# Altium footprint library Package_QFP.PcbLib: 84 footprints (part 2 of 6)
Each footprint in its own frame and in the unit in brackets; x right, y up, seen from the top. Pads: shape width x height; smd on the part's side, far side on the other; paste and mask are expansions set on the pad; w line width, h text height; cw(c..) or ccw(c..) is an arc to the next point about the centre after c.
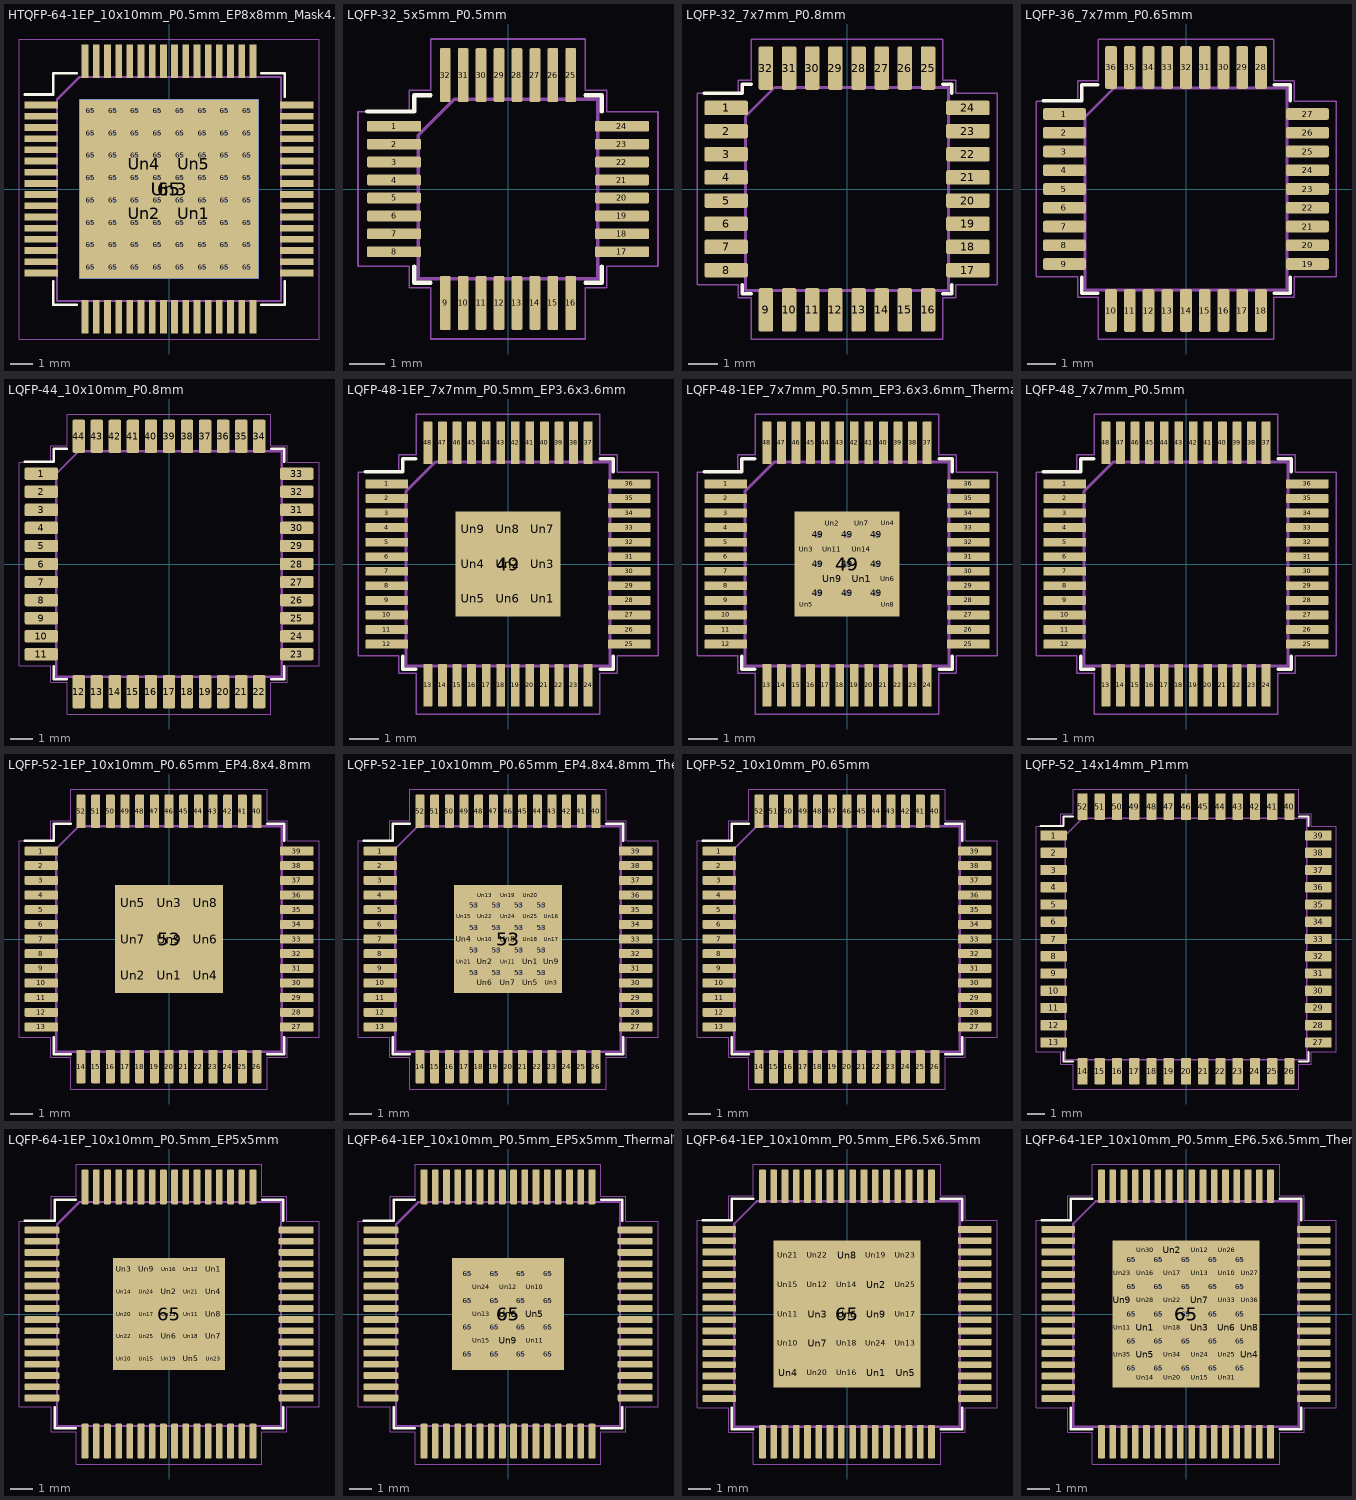
[diagram p1: the footprints below, top view; thin cyan lines are the x and y axes]

## HTQFP-64-1EP_10x10mm_P0.5mm_EP8x8mm_Mask4.4x4.4mm_ThermalVias [mm]
pads (135):
  rect 1.5x0.3 smd: 1(-5.7,3.75) 2(-5.7,3.25) 3(-5.7,2.75) 4(-5.7,2.25) 5(-5.7,1.75) 6(-5.7,1.25) 7(-5.7,0.75) 8(-5.7,0.25) 9(-5.7,-0.25) 10(-5.7,-0.75) 11(-5.7,-1.25) 12(-5.7,-1.75) 13(-5.7,-2.25) 14(-5.7,-2.75) 15(-5.7,-3.25) 16(-5.7,-3.75) 33(5.7,-3.75) 34(5.7,-3.25) 35(5.7,-2.75) 36(5.7,-2.25) 37(5.7,-1.75) 38(5.7,-1.25) 39(5.7,-0.75) 40(5.7,-0.25) 41(5.7,0.25) 42(5.7,0.75) 43(5.7,1.25) 44(5.7,1.75) 45(5.7,2.25) 46(5.7,2.75) 47(5.7,3.25) 48(5.7,3.75)
  rect 0.3x1.5 smd: 17(-3.75,-5.7) 18(-3.25,-5.7) 19(-2.75,-5.7) 20(-2.25,-5.7) 21(-1.75,-5.7) 22(-1.25,-5.7) 23(-0.75,-5.7) 24(-0.25,-5.7) 25(0.25,-5.7) 26(0.75,-5.7) 27(1.25,-5.7) 28(1.75,-5.7) 29(2.25,-5.7) 30(2.75,-5.7) 31(3.25,-5.7) 32(3.75,-5.7) 49(3.75,5.7) 50(3.25,5.7) 51(2.75,5.7) 52(2.25,5.7) 53(1.75,5.7) 54(1.25,5.7) 55(0.75,5.7) 56(0.25,5.7) 57(-0.25,5.7) 58(-0.75,5.7) 59(-1.25,5.7) 60(-1.75,5.7) 61(-2.25,5.7) 62(-2.75,5.7) 63(-3.25,5.7) 64(-3.75,5.7)
  round 0.5 hole 0.2: 65(-3.5,-3.5) 65(-3.5,-2.5) 65(-3.5,-1.5) 65(-3.5,-0.5) 65(-3.5,0.5) 65(-3.5,1.5) 65(-3.5,2.5) 65(-3.5,3.5) 65(-2.5,-3.5) 65(-2.5,-2.5) 65(-2.5,-1.5) 65(-2.5,-0.5) 65(-2.5,0.5) 65(-2.5,1.5) 65(-2.5,2.5) 65(-2.5,3.5) 65(-1.5,-3.5) 65(-1.5,-2.5) 65(-1.5,-1.5) 65(-1.5,-0.5) 65(-1.5,0.5) 65(-1.5,1.5) 65(-1.5,2.5) 65(-1.5,3.5) 65(-0.5,-3.5) 65(-0.5,-2.5) 65(-0.5,-1.5) 65(-0.5,-0.5) 65(-0.5,0.5) 65(-0.5,1.5) 65(-0.5,2.5) 65(-0.5,3.5) 65(0.5,-3.5) 65(0.5,-2.5) 65(0.5,-1.5) 65(0.5,-0.5) 65(0.5,0.5) 65(0.5,1.5) 65(0.5,2.5) 65(0.5,3.5) 65(1.5,-3.5) 65(1.5,-2.5) 65(1.5,-1.5) 65(1.5,-0.5) 65(1.5,0.5) 65(1.5,1.5) 65(1.5,2.5) 65(1.5,3.5) 65(2.5,-3.5) 65(2.5,-2.5) 65(2.5,-1.5) 65(2.5,-0.5) 65(2.5,0.5) 65(2.5,1.5) 65(2.5,2.5) 65(2.5,3.5) 65(3.5,-3.5) 65(3.5,-2.5) 65(3.5,-1.5) 65(3.5,-0.5) 65(3.5,0.5) 65(3.5,1.5) 65(3.5,2.5) 65(3.5,3.5)
  rect 8x8 smd: 65(0,0)
  rect 8x8 smd far side: 65(0,0)
  rect 1.75x1.75 on Top Paste: Un1(1.1,-1.1) Un2(-1.1,-1.1) Un4(-1.1,1.1) Un5(1.1,1.1)
  rect 4.4x4.4 on Top Solder: Un3(0,0)
F.SilkS:
  lines w0.12: -6.45,4.225 -5.175,4.225 -5.175,5.175 -4.125,5.175 ; -5.175,-4.125 -5.175,-5.175 -4.125,-5.175 ; 4.125,-5.175 5.175,-5.175 5.175,-4.125 ; 4.125,5.175 5.175,5.175 5.175,4.125
F.CrtYd:
  lines w0.05: -6.7,-6.7 6.7,-6.7 6.7,6.7 -6.7,6.7 -6.7,-6.7
F.Fab:
  lines w0.1: -5,-5 -5,4 -4,5 5,5 5,-5 -5,-5
  text "'.Designator'" at -4.047,-0.84 h1
3D body "TQFP-64-1EP_10x10mm_P0.5mm_EP8x8mm.step": height 1.1, standoff 0, extent -6,-6 6,6

## LQFP-32_5x5mm_P0.5mm [mm]
pads (32):
  rrect25% 1.5x0.3 smd: 1(-3.175,1.75) 2(-3.175,1.25) 3(-3.175,0.75) 4(-3.175,0.25) 5(-3.175,-0.25) 6(-3.175,-0.75) 7(-3.175,-1.25) 8(-3.175,-1.75) 17(3.175,-1.75) 18(3.175,-1.25) 19(3.175,-0.75) 20(3.175,-0.25) 21(3.175,0.25) 22(3.175,0.75) 23(3.175,1.25) 24(3.175,1.75)
  rrect25% 0.3x1.5 smd: 9(-1.75,-3.175) 10(-1.25,-3.175) 11(-0.75,-3.175) 12(-0.25,-3.175) 13(0.25,-3.175) 14(0.75,-3.175) 15(1.25,-3.175) 16(1.75,-3.175) 25(1.75,3.175) 26(1.25,3.175) 27(0.75,3.175) 28(0.25,3.175) 29(-0.25,3.175) 30(-0.75,3.175) 31(-1.25,3.175) 32(-1.75,3.175)
F.SilkS:
  lines w0.12: -3.925,2.16 -2.61,2.16 -2.61,2.61 -2.16,2.61 ; -2.61,-2.16 -2.61,-2.61 -2.16,-2.61 ; 2.16,-2.61 2.61,-2.61 2.61,-2.16 ; 2.16,2.61 2.61,2.61 2.61,2.16
F.CrtYd:
  lines w0.05: -4.18,-2.15 -2.75,-2.15 -2.75,-2.75 -2.15,-2.75 -2.15,-4.18 0,-4.18 2.15,-4.18 2.15,-2.75 2.75,-2.75 2.75,-2.15 4.18,-2.15 4.18,0 4.18,2.15 2.75,2.15 2.75,2.75 2.15,2.75 2.15,4.18 0,4.18 -2.15,4.18 -2.15,2.75 -2.75,2.75 -2.75,2.15 -4.18,2.15 -4.18,0 -4.18,-2.15
F.Fab:
  lines w0.1: -2.5,-2.5 2.5,-2.5 2.5,2.5 -1.5,2.5 -2.5,1.5 -2.5,-2.5
  text "'.Designator'" at -4.047,-0.84 h1
3D body "LQFP-32-1EP_5x5mm_P0.5mm_EP3.45x3.45mm.step": height 1.5, standoff 0, extent -3.5,-3.5 3.5,3.5

## LQFP-32_7x7mm_P0.8mm [mm]
pads (32):
  rrect25% 1.5x0.5 smd: 1(-4.175,2.8) 2(-4.175,2) 3(-4.175,1.2) 4(-4.175,0.4) 5(-4.175,-0.4) 6(-4.175,-1.2) 7(-4.175,-2) 8(-4.175,-2.8) 17(4.175,-2.8) 18(4.175,-2) 19(4.175,-1.2) 20(4.175,-0.4) 21(4.175,0.4) 22(4.175,1.2) 23(4.175,2) 24(4.175,2.8)
  rrect25% 0.5x1.5 smd: 9(-2.8,-4.175) 10(-2,-4.175) 11(-1.2,-4.175) 12(-0.4,-4.175) 13(0.4,-4.175) 14(1.2,-4.175) 15(2,-4.175) 16(2.8,-4.175) 25(2.8,4.175) 26(2,4.175) 27(1.2,4.175) 28(0.4,4.175) 29(-0.4,4.175) 30(-1.2,4.175) 31(-2,4.175) 32(-2.8,4.175)
F.SilkS:
  lines w0.12: -4.925,3.31 -3.61,3.31 -3.61,3.61 -3.31,3.61 ; -3.61,-3.31 -3.61,-3.61 -3.31,-3.61 ; 3.31,-3.61 3.61,-3.61 3.61,-3.31 ; 3.31,3.61 3.61,3.61 3.61,3.31
F.CrtYd:
  lines w0.05: -5.18,-3.3 -5.18,0 -5.18,3.3 -3.75,3.3 -3.75,3.75 -3.3,3.75 -3.3,5.18 0,5.18 3.3,5.18 3.3,3.75 3.75,3.75 3.75,3.3 5.18,3.3 5.18,0 5.18,-3.3 3.75,-3.3 3.75,-3.75 3.3,-3.75 3.3,-5.18 0,-5.18 -3.3,-5.18 -3.3,-3.75 -3.75,-3.75 -3.75,-3.3 -5.18,-3.3
F.Fab:
  lines w0.1: -3.5,-3.5 -3.5,2.5 -2.5,3.5 3.5,3.5 3.5,-3.5 -3.5,-3.5
  text "'.Designator'" at -4.047,-0.84 h1
3D body "TQFP-32_7x7mm_P0.8mm.step": height 1.1, standoff 0, extent -4.5,-4.5 4.5,4.5

## LQFP-36_7x7mm_P0.65mm [mm]
pads (36):
  rrect25% 1.475x0.4 smd: 1(-4.213,2.6) 2(-4.213,1.95) 3(-4.213,1.3) 4(-4.213,0.65) 5(-4.213,0) 6(-4.213,-0.65) 7(-4.213,-1.3) 8(-4.213,-1.95) 9(-4.213,-2.6) 19(4.213,-2.6) 20(4.213,-1.95) 21(4.213,-1.3) 22(4.213,-0.65) 23(4.213,0) 24(4.213,0.65) 25(4.213,1.3) 26(4.213,1.95) 27(4.213,2.6)
  rrect25% 0.4x1.475 smd: 10(-2.6,-4.213) 11(-1.95,-4.213) 12(-1.3,-4.213) 13(-0.65,-4.213) 14(0,-4.213) 15(0.65,-4.213) 16(1.3,-4.213) 17(1.95,-4.213) 18(2.6,-4.213) 28(2.6,4.213) 29(1.95,4.213) 30(1.3,4.213) 31(0.65,4.213) 32(0,4.213) 33(-0.65,4.213) 34(-1.3,4.213) 35(-1.95,4.213) 36(-2.6,4.213)
F.SilkS:
  lines w0.12: -4.95,3.06 -3.61,3.06 -3.61,3.61 -3.06,3.61 ; -3.61,-3.06 -3.61,-3.61 -3.06,-3.61 ; 3.06,-3.61 3.61,-3.61 3.61,-3.06 ; 3.06,3.61 3.61,3.61 3.61,3.06
F.CrtYd:
  lines w0.05: -5.2,-3.05 -3.75,-3.05 -3.75,-3.75 -3.05,-3.75 -3.05,-5.2 0,-5.2 3.05,-5.2 3.05,-3.75 3.75,-3.75 3.75,-3.05 5.2,-3.05 5.2,0 5.2,3.05 3.75,3.05 3.75,3.75 3.05,3.75 3.05,5.2 0,5.2 -3.05,5.2 -3.05,3.75 -3.75,3.75 -3.75,3.05 -5.2,3.05 -5.2,0 -5.2,-3.05
F.Fab:
  lines w0.1: -3.5,-3.5 3.5,-3.5 3.5,3.5 -2.5,3.5 -3.5,2.5 -3.5,-3.5
  text "'.Designator'" at -4.047,-0.84 h1
3D body "LQFP-36_7x7mm_P0.65mm.step": height 1.8, standoff 0, extent -4.5,-4.5 4.5,4.5

## LQFP-44_10x10mm_P0.8mm [mm]
pads (44):
  rrect25% 1.475x0.55 smd: 1(-5.663,4) 2(-5.663,3.2) 3(-5.663,2.4) 4(-5.663,1.6) 5(-5.663,0.8) 6(-5.663,0) 7(-5.663,-0.8) 8(-5.663,-1.6) 9(-5.663,-2.4) 10(-5.663,-3.2) 11(-5.663,-4) 23(5.663,-4) 24(5.663,-3.2) 25(5.663,-2.4) 26(5.663,-1.6) 27(5.663,-0.8) 28(5.663,0) 29(5.663,0.8) 30(5.663,1.6) 31(5.663,2.4) 32(5.663,3.2) 33(5.663,4)
  rrect25% 0.55x1.475 smd: 12(-4,-5.663) 13(-3.2,-5.663) 14(-2.4,-5.663) 15(-1.6,-5.663) 16(-0.8,-5.663) 17(0,-5.663) 18(0.8,-5.663) 19(1.6,-5.663) 20(2.4,-5.663) 21(3.2,-5.663) 22(4,-5.663) 34(4,5.663) 35(3.2,5.663) 36(2.4,5.663) 37(1.6,5.663) 38(0.8,5.663) 39(0,5.663) 40(-0.8,5.663) 41(-1.6,5.663) 42(-2.4,5.663) 43(-3.2,5.663) 44(-4,5.663)
F.SilkS:
  lines w0.12: -6.4,4.535 -5.11,4.535 -5.11,5.11 -4.535,5.11 ; -5.11,-4.535 -5.11,-5.11 -4.535,-5.11 ; 4.535,-5.11 5.11,-5.11 5.11,-4.535 ; 4.535,5.11 5.11,5.11 5.11,4.535
F.CrtYd:
  lines w0.05: -6.65,-4.52 -6.65,0 -6.65,4.52 -5.25,4.52 -5.25,5.25 -4.52,5.25 -4.52,6.65 0,6.65 4.52,6.65 4.52,5.25 5.25,5.25 5.25,4.52 6.65,4.52 6.65,0 6.65,-4.52 5.25,-4.52 5.25,-5.25 4.52,-5.25 4.52,-6.65 0,-6.65 -4.52,-6.65 -4.52,-5.25 -5.25,-5.25 -5.25,-4.52 -6.65,-4.52
F.Fab:
  lines w0.1: -5,-5 5,-5 5,5 -4,5 -5,4 -5,-5
  text "'.Designator'" at -4.047,-0.84 h1
3D body "TQFP-44_10x10mm_P0.8mm.step": height 1.1, standoff 0, extent -6,-6 6,6

## LQFP-48-1EP_7x7mm_P0.5mm_EP3.6x3.6mm [mm]
pads (58):
  rrect25% 1.475x0.3 smd: 1(-4.163,2.75) 2(-4.163,2.25) 3(-4.163,1.75) 4(-4.163,1.25) 5(-4.163,0.75) 6(-4.163,0.25) 7(-4.163,-0.25) 8(-4.163,-0.75) 9(-4.163,-1.25) 10(-4.163,-1.75) 11(-4.163,-2.25) 12(-4.163,-2.75) 25(4.163,-2.75) 26(4.163,-2.25) 27(4.163,-1.75) 28(4.163,-1.25) 29(4.163,-0.75) 30(4.163,-0.25) 31(4.163,0.25) 32(4.163,0.75) 33(4.163,1.25) 34(4.163,1.75) 35(4.163,2.25) 36(4.163,2.75)
  rrect25% 0.3x1.475 smd: 13(-2.75,-4.163) 14(-2.25,-4.163) 15(-1.75,-4.163) 16(-1.25,-4.163) 17(-0.75,-4.163) 18(-0.25,-4.163) 19(0.25,-4.163) 20(0.75,-4.163) 21(1.25,-4.163) 22(1.75,-4.163) 23(2.25,-4.163) 24(2.75,-4.163) 37(2.75,4.163) 38(2.25,4.163) 39(1.75,4.163) 40(1.25,4.163) 41(0.75,4.163) 42(0.25,4.163) 43(-0.25,4.163) 44(-0.75,4.163) 45(-1.25,4.163) 46(-1.75,4.163) 47(-2.25,4.163) 48(-2.75,4.163)
  rect 3.6x3.6 smd: 49(0,0)
  rrect25% 0.97x0.97 on Top Paste: Un1(1.2,-1.2) Un2(0,0) Un3(1.2,0) Un4(-1.2,0) Un5(-1.2,-1.2) Un6(0,-1.2) Un7(1.2,1.2) Un8(0,1.2) Un9(-1.2,1.2)
F.SilkS:
  lines w0.12: -4.9,3.16 -3.61,3.16 -3.61,3.61 -3.16,3.61 ; -3.61,-3.16 -3.61,-3.61 -3.16,-3.61 ; 3.16,-3.61 3.61,-3.61 3.61,-3.16 ; 3.16,3.61 3.61,3.61 3.61,3.16
F.CrtYd:
  lines w0.05: -5.15,-3.15 -5.15,0 -5.15,3.15 -3.75,3.15 -3.75,3.75 -3.15,3.75 -3.15,5.15 0,5.15 3.15,5.15 3.15,3.75 3.75,3.75 3.75,3.15 5.15,3.15 5.15,0 5.15,-3.15 3.75,-3.15 3.75,-3.75 3.15,-3.75 3.15,-5.15 0,-5.15 -3.15,-5.15 -3.15,-3.75 -3.75,-3.75 -3.75,-3.15 -5.15,-3.15
F.Fab:
  lines w0.1: -3.5,-3.5 -3.5,2.5 -2.5,3.5 3.5,3.5 3.5,-3.5 -3.5,-3.5
  text "'.Designator'" at -4.047,-0.84 h1
3D body "LQFP-48_7x7mm_P0.5mm.step": height 1.5, standoff 0, extent -4.5,-4.5 4.5,4.5

## LQFP-48-1EP_7x7mm_P0.5mm_EP3.6x3.6mm_ThermalVias [mm]
pads (75):
  rrect25% 1.475x0.3 smd: 1(-4.163,2.75) 2(-4.163,2.25) 3(-4.163,1.75) 4(-4.163,1.25) 5(-4.163,0.75) 6(-4.163,0.25) 7(-4.163,-0.25) 8(-4.163,-0.75) 9(-4.163,-1.25) 10(-4.163,-1.75) 11(-4.163,-2.25) 12(-4.163,-2.75) 25(4.163,-2.75) 26(4.163,-2.25) 27(4.163,-1.75) 28(4.163,-1.25) 29(4.163,-0.75) 30(4.163,-0.25) 31(4.163,0.25) 32(4.163,0.75) 33(4.163,1.25) 34(4.163,1.75) 35(4.163,2.25) 36(4.163,2.75)
  rrect25% 0.3x1.475 smd: 13(-2.75,-4.163) 14(-2.25,-4.163) 15(-1.75,-4.163) 16(-1.25,-4.163) 17(-0.75,-4.163) 18(-0.25,-4.163) 19(0.25,-4.163) 20(0.75,-4.163) 21(1.25,-4.163) 22(1.75,-4.163) 23(2.25,-4.163) 24(2.75,-4.163) 37(2.75,4.163) 38(2.25,4.163) 39(1.75,4.163) 40(1.25,4.163) 41(0.75,4.163) 42(0.25,4.163) 43(-0.25,4.163) 44(-0.75,4.163) 45(-1.25,4.163) 46(-1.75,4.163) 47(-2.25,4.163) 48(-2.75,4.163)
  round 0.5 hole 0.2: 49(-1,-1) 49(-1,0) 49(-1,1) 49(0,-1) 49(0,0) 49(0,1) 49(1,-1) 49(1,0) 49(1,1)
  rect 3.6x3.6 smd: 49(0,0)
  rect 2.5x2.5 smd far side: 49(0,0)
  rrect25% 0.806x0.806 on Top Paste: Un1(0.5,-0.5) Un9(-0.5,-0.5) Un11(-0.5,0.5) Un14(0.5,0.5)
  round 0.568 on Top Paste: Un2(-0.5,1.4) Un3(-1.4,0.5) Un6(1.4,-0.5) Un7(0.5,1.4) Un10(-1.4,-0.5) Un12(-0.5,-1.4) Un15(0.5,-1.4) Un16(1.4,0.5)
  round 0.555 on Top Paste: Un4(1.4,1.4) Un5(-1.4,-1.4) Un8(1.4,-1.4) Un13(-1.4,1.4)
F.SilkS:
  lines w0.12: -4.9,3.16 -3.61,3.16 -3.61,3.61 -3.16,3.61 ; -3.61,-3.16 -3.61,-3.61 -3.16,-3.61 ; 3.16,-3.61 3.61,-3.61 3.61,-3.16 ; 3.16,3.61 3.61,3.61 3.61,3.16
F.Paste:
  region: 1.646,0.174 1.218,0.174 1.154,0.237 1.154,0.763 1.218,0.826 1.646,0.826
  region: 0.826,-1.218 0.826,-1.646 0.174,-1.646 0.174,-1.218 0.237,-1.154 0.763,-1.154
  region: -1.168,1.243 -1.243,1.168 -1.632,1.168 -1.632,1.632 -1.168,1.632
  region: -0.174,-1.218 -0.174,-1.646 -0.826,-1.646 -0.826,-1.218 -0.763,-1.154 -0.237,-1.154
  region: -1.154,-0.237 -1.154,-0.763 -1.218,-0.826 -1.646,-0.826 -1.646,-0.174 -1.218,-0.174
  region: 1.632,-1.632 1.168,-1.632 1.168,-1.243 1.243,-1.168 1.632,-1.168
  region: 0.826,1.218 0.763,1.154 0.237,1.154 0.174,1.218 0.174,1.646 0.826,1.646
  region: 1.646,-0.826 1.218,-0.826 1.154,-0.763 1.154,-0.237 1.218,-0.174 1.646,-0.174
  region: -1.168,-1.243 -1.168,-1.632 -1.632,-1.632 -1.632,-1.168 -1.243,-1.168
  region: 1.632,1.168 1.243,1.168 1.168,1.243 1.168,1.632 1.632,1.632
  region: -1.154,0.763 -1.154,0.237 -1.218,0.174 -1.646,0.174 -1.646,0.826 -1.218,0.826
  region: -0.174,1.218 -0.237,1.154 -0.763,1.154 -0.826,1.218 -0.826,1.646 -0.174,1.646
F.CrtYd:
  lines w0.05: -5.15,-3.15 -5.15,0 -5.15,3.15 -3.75,3.15 -3.75,3.75 -3.15,3.75 -3.15,5.15 0,5.15 3.15,5.15 3.15,3.75 3.75,3.75 3.75,3.15 5.15,3.15 5.15,0 5.15,-3.15 3.75,-3.15 3.75,-3.75 3.15,-3.75 3.15,-5.15 0,-5.15 -3.15,-5.15 -3.15,-3.75 -3.75,-3.75 -3.75,-3.15 -5.15,-3.15
F.Fab:
  lines w0.1: -3.5,-3.5 -3.5,2.5 -2.5,3.5 3.5,3.5 3.5,-3.5 -3.5,-3.5
  text "'.Designator'" at -4.047,-0.84 h1
3D body "LQFP-48-1EP_7x7mm_P0.5mm_EP3.6x3.6mm.step": height 1.6, standoff 0, extent -4.66,-4.66 4.66,4.66

## LQFP-48_7x7mm_P0.5mm [mm]
pads (48):
  rrect25% 1.475x0.3 smd mask+0.051: 1(-4.163,2.75) 2(-4.163,2.25) 3(-4.163,1.75) 4(-4.163,1.25) 5(-4.163,0.75) 6(-4.163,0.25) 7(-4.163,-0.25) 8(-4.163,-0.75) 9(-4.163,-1.25) 10(-4.163,-1.75) 11(-4.163,-2.25) 12(-4.163,-2.75) 25(4.163,-2.75) 26(4.163,-2.25) 27(4.163,-1.75) 28(4.163,-1.25) 29(4.163,-0.75) 30(4.163,-0.25) 31(4.163,0.25) 32(4.163,0.75) 33(4.163,1.25) 34(4.163,1.75) 35(4.163,2.25) 36(4.163,2.75)
  rrect25% 0.3x1.475 smd mask+0.051: 13(-2.75,-4.163) 14(-2.25,-4.163) 15(-1.75,-4.163) 16(-1.25,-4.163) 17(-0.75,-4.163) 18(-0.25,-4.163) 19(0.25,-4.163) 20(0.75,-4.163) 21(1.25,-4.163) 22(1.75,-4.163) 23(2.25,-4.163) 24(2.75,-4.163) 37(2.75,4.163) 38(2.25,4.163) 39(1.75,4.163) 40(1.25,4.163) 41(0.75,4.163) 42(0.25,4.163) 43(-0.25,4.163) 44(-0.75,4.163) 45(-1.25,4.163) 46(-1.75,4.163) 47(-2.25,4.163) 48(-2.75,4.163)
F.SilkS:
  lines w0.12: -4.9,3.16 -3.61,3.16 -3.61,3.61 -3.16,3.61 ; -3.61,-3.16 -3.61,-3.61 -3.16,-3.61 ; 3.16,-3.61 3.61,-3.61 3.61,-3.16 ; 3.16,3.61 3.61,3.61 3.61,3.16
F.CrtYd:
  lines w0.05: -5.15,-3.15 -5.15,0 -5.15,3.15 -3.75,3.15 -3.75,3.75 -3.15,3.75 -3.15,5.15 0,5.15 3.15,5.15 3.15,3.75 3.75,3.75 3.75,3.15 5.15,3.15 5.15,0 5.15,-3.15 3.75,-3.15 3.75,-3.75 3.15,-3.75 3.15,-5.15 0,-5.15 -3.15,-5.15 -3.15,-3.75 -3.75,-3.75 -3.75,-3.15 -5.15,-3.15
F.Fab:
  lines w0.1: -3.5,-3.5 -3.5,2.5 -2.5,3.5 3.5,3.5 3.5,-3.5 -3.5,-3.5
  text "'.Designator'" at -3.897,-0.357 h1
3D body "LQFP-48_7x7mm_P0.5mm.step": height 1.5, standoff 0, extent -4.5,-4.5 4.5,4.5

## LQFP-52-1EP_10x10mm_P0.65mm_EP4.8x4.8mm [mm]
pads (62):
  rrect25% 1.475x0.4 smd: 1(-5.663,3.9) 2(-5.663,3.25) 3(-5.663,2.6) 4(-5.663,1.95) 5(-5.663,1.3) 6(-5.663,0.65) 7(-5.663,0) 8(-5.663,-0.65) 9(-5.663,-1.3) 10(-5.663,-1.95) 11(-5.663,-2.6) 12(-5.663,-3.25) 13(-5.663,-3.9) 27(5.663,-3.9) 28(5.663,-3.25) 29(5.663,-2.6) 30(5.663,-1.95) 31(5.663,-1.3) 32(5.663,-0.65) 33(5.663,0) 34(5.663,0.65) 35(5.663,1.3) 36(5.663,1.95) 37(5.663,2.6) 38(5.663,3.25) 39(5.663,3.9)
  rrect25% 0.4x1.475 smd: 14(-3.9,-5.663) 15(-3.25,-5.663) 16(-2.6,-5.663) 17(-1.95,-5.663) 18(-1.3,-5.663) 19(-0.65,-5.663) 20(0,-5.663) 21(0.65,-5.663) 22(1.3,-5.663) 23(1.95,-5.663) 24(2.6,-5.663) 25(3.25,-5.663) 26(3.9,-5.663) 40(3.9,5.663) 41(3.25,5.663) 42(2.6,5.663) 43(1.95,5.663) 44(1.3,5.663) 45(0.65,5.663) 46(0,5.663) 47(-0.65,5.663) 48(-1.3,5.663) 49(-1.95,5.663) 50(-2.6,5.663) 51(-3.25,5.663) 52(-3.9,5.663)
  rect 4.8x4.8 smd: 53(0,0)
  rrect19% 1.29x1.29 on Top Paste: Un1(0,-1.6) Un2(-1.6,-1.6) Un3(0,1.6) Un4(1.6,-1.6) Un5(-1.6,1.6) Un6(1.6,0) Un7(-1.6,0) Un8(1.6,1.6) Un9(0,0)
F.SilkS:
  lines w0.12: -6.4,4.36 -5.11,4.36 -5.11,5.11 -4.36,5.11 ; -5.11,-4.36 -5.11,-5.11 -4.36,-5.11 ; 4.36,-5.11 5.11,-5.11 5.11,-4.36 ; 4.36,5.11 5.11,5.11 5.11,4.36
F.CrtYd:
  lines w0.05: -6.65,-4.35 -6.65,0 -6.65,4.35 -5.25,4.35 -5.25,5.25 -4.35,5.25 -4.35,6.65 0,6.65 4.35,6.65 4.35,5.25 5.25,5.25 5.25,4.35 6.65,4.35 6.65,0 6.65,-4.35 5.25,-4.35 5.25,-5.25 4.35,-5.25 4.35,-6.65 0,-6.65 -4.35,-6.65 -4.35,-5.25 -5.25,-5.25 -5.25,-4.35 -6.65,-4.35
F.Fab:
  lines w0.1: -5,-5 5,-5 5,5 -4,5 -5,4 -5,-5
  text "'.Designator'" at -4.047,-0.84 h1
3D body "LQFP-52-1EP_10x10mm_P0.65mm_EP4.8x4.8mm.step": height 1.5, standoff 0, extent -6,-6 6,6

## LQFP-52-1EP_10x10mm_P0.65mm_EP4.8x4.8mm_ThermalVias [mm]
pads (95):
  rrect25% 1.475x0.4 smd: 1(-5.663,3.9) 2(-5.663,3.25) 3(-5.663,2.6) 4(-5.663,1.95) 5(-5.663,1.3) 6(-5.663,0.65) 7(-5.663,0) 8(-5.663,-0.65) 9(-5.663,-1.3) 10(-5.663,-1.95) 11(-5.663,-2.6) 12(-5.663,-3.25) 13(-5.663,-3.9) 27(5.663,-3.9) 28(5.663,-3.25) 29(5.663,-2.6) 30(5.663,-1.95) 31(5.663,-1.3) 32(5.663,-0.65) 33(5.663,0) 34(5.663,0.65) 35(5.663,1.3) 36(5.663,1.95) 37(5.663,2.6) 38(5.663,3.25) 39(5.663,3.9)
  rrect25% 0.4x1.475 smd: 14(-3.9,-5.663) 15(-3.25,-5.663) 16(-2.6,-5.663) 17(-1.95,-5.663) 18(-1.3,-5.663) 19(-0.65,-5.663) 20(0,-5.663) 21(0.65,-5.663) 22(1.3,-5.663) 23(1.95,-5.663) 24(2.6,-5.663) 25(3.25,-5.663) 26(3.9,-5.663) 40(3.9,5.663) 41(3.25,5.663) 42(2.6,5.663) 43(1.95,5.663) 44(1.3,5.663) 45(0.65,5.663) 46(0,5.663) 47(-0.65,5.663) 48(-1.3,5.663) 49(-1.95,5.663) 50(-2.6,5.663) 51(-3.25,5.663) 52(-3.9,5.663)
  round 0.5 hole 0.2: 53(-1.5,-1.5) 53(-1.5,-0.5) 53(-1.5,0.5) 53(-1.5,1.5) 53(-0.5,-1.5) 53(-0.5,-0.5) 53(-0.5,0.5) 53(-0.5,1.5) 53(0.5,-1.5) 53(0.5,-0.5) 53(0.5,0.5) 53(0.5,1.5) 53(1.5,-1.5) 53(1.5,-0.5) 53(1.5,0.5) 53(1.5,1.5)
  rect 4.8x4.8 smd: 53(0,0)
  rect 3.5x3.5 smd far side: 53(0,0)
  rrect25% 0.806x0.806 on Top Paste: Un1(1,-1) Un2(-1,-1) Un8(0,0) Un10(-1,0) Un11(0,-1) Un18(1,0) Un22(-1,1) Un24(0,1) Un25(1,1)
  round 0.649 on Top Paste: Un3(1.95,-1.95) Un12(-1.95,-1.95) Un14(1.95,1.95) Un23(-1.95,1.95)
  rrect25% 0.726x0.806 on Top Paste: Un4(-1.95,0) Un9(1.95,-1) Un15(-1.95,1) Un16(1.95,1) Un17(1.95,0) Un21(-1.95,-1)
  rrect25% 0.806x0.726 on Top Paste: Un5(1,-1.95) Un6(-1,-1.95) Un7(0,-1.95) Un13(-1,1.95) Un19(0,1.95) Un20(1,1.95)
F.SilkS:
  lines w0.12: -6.4,4.36 -5.11,4.36 -5.11,5.11 -4.36,5.11 ; -5.11,-4.36 -5.11,-5.11 -4.36,-5.11 ; 4.36,-5.11 5.11,-5.11 5.11,-4.36 ; 4.36,5.11 5.11,5.11 5.11,4.36
F.Paste:
  region: -1.664,1.727 -1.727,1.664 -2.236,1.664 -2.236,2.236 -1.664,2.236
  region: 2.236,1.664 1.727,1.664 1.664,1.727 1.664,2.236 2.236,2.236
  region: -1.664,-1.727 -1.664,-2.236 -2.236,-2.236 -2.236,-1.664 -1.727,-1.664
  region: 2.236,-2.236 1.664,-2.236 1.664,-1.727 1.727,-1.664 2.236,-1.664
F.CrtYd:
  lines w0.05: -6.65,-4.35 -5.25,-4.35 -5.25,-5.25 -4.35,-5.25 -4.35,-6.65 0,-6.65 4.35,-6.65 4.35,-5.25 5.25,-5.25 5.25,-4.35 6.65,-4.35 6.65,0 6.65,4.35 5.25,4.35 5.25,5.25 4.35,5.25 4.35,6.65 0,6.65 -4.35,6.65 -4.35,5.25 -5.25,5.25 -5.25,4.35 -6.65,4.35 -6.65,0 -6.65,-4.35
F.Fab:
  lines w0.1: -5,-5 5,-5 5,5 -4,5 -5,4 -5,-5
  text "'.Designator'" at -4.047,-0.84 h1
3D body "LQFP-52-1EP_10x10mm_P0.65mm_EP4.8x4.8mm.step": height 1.5, standoff 0, extent -6,-6 6,6

## LQFP-52_10x10mm_P0.65mm [mm]
pads (52):
  rrect25% 1.475x0.4 smd: 1(-5.663,3.9) 2(-5.663,3.25) 3(-5.663,2.6) 4(-5.663,1.95) 5(-5.663,1.3) 6(-5.663,0.65) 7(-5.663,0) 8(-5.663,-0.65) 9(-5.663,-1.3) 10(-5.663,-1.95) 11(-5.663,-2.6) 12(-5.663,-3.25) 13(-5.663,-3.9) 27(5.663,-3.9) 28(5.663,-3.25) 29(5.663,-2.6) 30(5.663,-1.95) 31(5.663,-1.3) 32(5.663,-0.65) 33(5.663,0) 34(5.663,0.65) 35(5.663,1.3) 36(5.663,1.95) 37(5.663,2.6) 38(5.663,3.25) 39(5.663,3.9)
  rrect25% 0.4x1.475 smd: 14(-3.9,-5.663) 15(-3.25,-5.663) 16(-2.6,-5.663) 17(-1.95,-5.663) 18(-1.3,-5.663) 19(-0.65,-5.663) 20(0,-5.663) 21(0.65,-5.663) 22(1.3,-5.663) 23(1.95,-5.663) 24(2.6,-5.663) 25(3.25,-5.663) 26(3.9,-5.663) 40(3.9,5.663) 41(3.25,5.663) 42(2.6,5.663) 43(1.95,5.663) 44(1.3,5.663) 45(0.65,5.663) 46(0,5.663) 47(-0.65,5.663) 48(-1.3,5.663) 49(-1.95,5.663) 50(-2.6,5.663) 51(-3.25,5.663) 52(-3.9,5.663)
F.SilkS:
  lines w0.12: -6.4,4.36 -5.11,4.36 -5.11,5.11 -4.36,5.11 ; -5.11,-4.36 -5.11,-5.11 -4.36,-5.11 ; 4.36,-5.11 5.11,-5.11 5.11,-4.36 ; 4.36,5.11 5.11,5.11 5.11,4.36
F.CrtYd:
  lines w0.05: -6.65,-4.35 -6.65,0 -6.65,4.35 -5.25,4.35 -5.25,5.25 -4.35,5.25 -4.35,6.65 0,6.65 4.35,6.65 4.35,5.25 5.25,5.25 5.25,4.35 6.65,4.35 6.65,0 6.65,-4.35 5.25,-4.35 5.25,-5.25 4.35,-5.25 4.35,-6.65 0,-6.65 -4.35,-6.65 -4.35,-5.25 -5.25,-5.25 -5.25,-4.35 -6.65,-4.35
F.Fab:
  lines w0.1: -5,-5 -5,4 -4,5 5,5 5,-5 -5,-5
  text "'.Designator'" at -4.047,-0.84 h1
3D body "LQFP-52_10x10mm_P0.65mm.step": height 1.5, standoff 0, extent -6,-6 6,6

## LQFP-52_14x14mm_P1mm [mm]
pads (52):
  rrect25% 1.55x0.6 smd: 1(-7.675,6) 2(-7.675,5) 3(-7.675,4) 4(-7.675,3) 5(-7.675,2) 6(-7.675,1) 7(-7.675,0) 8(-7.675,-1) 9(-7.675,-2) 10(-7.675,-3) 11(-7.675,-4) 12(-7.675,-5) 13(-7.675,-6) 27(7.675,-6) 28(7.675,-5) 29(7.675,-4) 30(7.675,-3) 31(7.675,-2) 32(7.675,-1) 33(7.675,0) 34(7.675,1) 35(7.675,2) 36(7.675,3) 37(7.675,4) 38(7.675,5) 39(7.675,6)
  rrect25% 0.6x1.55 smd: 14(-6,-7.675) 15(-5,-7.675) 16(-4,-7.675) 17(-3,-7.675) 18(-2,-7.675) 19(-1,-7.675) 20(0,-7.675) 21(1,-7.675) 22(2,-7.675) 23(3,-7.675) 24(4,-7.675) 25(5,-7.675) 26(6,-7.675) 40(6,7.675) 41(5,7.675) 42(4,7.675) 43(3,7.675) 44(2,7.675) 45(1,7.675) 46(0,7.675) 47(-1,7.675) 48(-2,7.675) 49(-3,7.675) 50(-4,7.675) 51(-5,7.675) 52(-6,7.675)
F.SilkS:
  lines w0.12: -8.45,6.56 -7.11,6.56 -7.11,7.11 -6.56,7.11 ; -7.11,-6.56 -7.11,-7.11 -6.56,-7.11 ; 6.56,-7.11 7.11,-7.11 7.11,-6.56 ; 6.56,7.11 7.11,7.11 7.11,6.56
F.CrtYd:
  lines w0.05: -8.7,-6.55 -7.25,-6.55 -7.25,-7.25 -6.55,-7.25 -6.55,-8.7 0,-8.7 6.55,-8.7 6.55,-7.25 7.25,-7.25 7.25,-6.55 8.7,-6.55 8.7,0 8.7,6.55 7.25,6.55 7.25,7.25 6.55,7.25 6.55,8.7 0,8.7 -6.55,8.7 -6.55,7.25 -7.25,7.25 -7.25,6.55 -8.7,6.55 -8.7,0 -8.7,-6.55
F.Fab:
  lines w0.1: -7,-7 7,-7 7,7 -6,7 -7,6 -7,-7
  text "'.Designator'" at -4.047,-0.84 h1
3D body "LQFP-52_14x14mm_P1mm.step": height 1.5, standoff 0, extent -8,-8 8,8

## LQFP-64-1EP_10x10mm_P0.5mm_EP5x5mm [mm]
pads (90):
  rrect25% 1.55x0.3 smd: 1(-5.675,3.75) 2(-5.675,3.25) 3(-5.675,2.75) 4(-5.675,2.25) 5(-5.675,1.75) 6(-5.675,1.25) 7(-5.675,0.75) 8(-5.675,0.25) 9(-5.675,-0.25) 10(-5.675,-0.75) 11(-5.675,-1.25) 12(-5.675,-1.75) 13(-5.675,-2.25) 14(-5.675,-2.75) 15(-5.675,-3.25) 16(-5.675,-3.75) 33(5.675,-3.75) 34(5.675,-3.25) 35(5.675,-2.75) 36(5.675,-2.25) 37(5.675,-1.75) 38(5.675,-1.25) 39(5.675,-0.75) 40(5.675,-0.25) 41(5.675,0.25) 42(5.675,0.75) 43(5.675,1.25) 44(5.675,1.75) 45(5.675,2.25) 46(5.675,2.75) 47(5.675,3.25) 48(5.675,3.75)
  rrect25% 0.3x1.55 smd: 17(-3.75,-5.675) 18(-3.25,-5.675) 19(-2.75,-5.675) 20(-2.25,-5.675) 21(-1.75,-5.675) 22(-1.25,-5.675) 23(-0.75,-5.675) 24(-0.25,-5.675) 25(0.25,-5.675) 26(0.75,-5.675) 27(1.25,-5.675) 28(1.75,-5.675) 29(2.25,-5.675) 30(2.75,-5.675) 31(3.25,-5.675) 32(3.75,-5.675) 49(3.75,5.675) 50(3.25,5.675) 51(2.75,5.675) 52(2.25,5.675) 53(1.75,5.675) 54(1.25,5.675) 55(0.75,5.675) 56(0.25,5.675) 57(-0.25,5.675) 58(-0.75,5.675) 59(-1.25,5.675) 60(-1.75,5.675) 61(-2.25,5.675) 62(-2.75,5.675) 63(-3.25,5.675) 64(-3.75,5.675)
  rect 5x5 smd: 65(0,0)
  rrect25% 0.81x0.81 on Top Paste: Un1(2,2) Un2(0,1) Un3(-2,2) Un4(2,1) Un5(1,-2) Un6(0,-1) Un7(2,-1) Un8(2,0) Un9(-1,2) Un10(-2,-2) Un11(1,0) Un12(1,2) Un13(0,0) Un14(-2,1) Un15(-1,-2) Un16(0,2) Un17(-1,0) Un18(1,-1) Un19(0,-2) Un20(-2,0) Un21(1,1) Un22(-2,-1) Un23(2,-2) Un24(-1,1) Un25(-1,-1)
F.SilkS:
  lines w0.12: -6.45,4.16 -5.11,4.16 -5.11,5.11 -4.16,5.11 ; -5.11,-4.16 -5.11,-5.11 -4.16,-5.11 ; 4.16,-5.11 5.11,-5.11 5.11,-4.16 ; 4.16,5.11 5.11,5.11 5.11,4.16
F.CrtYd:
  lines w0.05: -6.7,-4.15 -6.7,0 -6.7,4.15 -5.25,4.15 -5.25,5.25 -4.15,5.25 -4.15,6.7 0,6.7 4.15,6.7 4.15,5.25 5.25,5.25 5.25,4.15 6.7,4.15 6.7,0 6.7,-4.15 5.25,-4.15 5.25,-5.25 4.15,-5.25 4.15,-6.7 0,-6.7 -4.15,-6.7 -4.15,-5.25 -5.25,-5.25 -5.25,-4.15 -6.7,-4.15
F.Fab:
  lines w0.1: -5,-5 5,-5 5,5 -4,5 -5,4 -5,-5
  text "'.Designator'" at -4.047,-0.84 h1
3D body "LQFP-64-1EP_10x10mm_P0.5mm_EP6.5x6.5mm.step": height 1.5, standoff 0, extent -6,-6 6,6

## LQFP-64-1EP_10x10mm_P0.5mm_EP5x5mm_ThermalVias [mm]
pads (107):
  rrect25% 1.55x0.3 smd: 1(-5.675,3.75) 2(-5.675,3.25) 3(-5.675,2.75) 4(-5.675,2.25) 5(-5.675,1.75) 6(-5.675,1.25) 7(-5.675,0.75) 8(-5.675,0.25) 9(-5.675,-0.25) 10(-5.675,-0.75) 11(-5.675,-1.25) 12(-5.675,-1.75) 13(-5.675,-2.25) 14(-5.675,-2.75) 15(-5.675,-3.25) 16(-5.675,-3.75) 33(5.675,-3.75) 34(5.675,-3.25) 35(5.675,-2.75) 36(5.675,-2.25) 37(5.675,-1.75) 38(5.675,-1.25) 39(5.675,-0.75) 40(5.675,-0.25) 41(5.675,0.25) 42(5.675,0.75) 43(5.675,1.25) 44(5.675,1.75) 45(5.675,2.25) 46(5.675,2.75) 47(5.675,3.25) 48(5.675,3.75)
  rrect25% 0.3x1.55 smd: 17(-3.75,-5.675) 18(-3.25,-5.675) 19(-2.75,-5.675) 20(-2.25,-5.675) 21(-1.75,-5.675) 22(-1.25,-5.675) 23(-0.75,-5.675) 24(-0.25,-5.675) 25(0.25,-5.675) 26(0.75,-5.675) 27(1.25,-5.675) 28(1.75,-5.675) 29(2.25,-5.675) 30(2.75,-5.675) 31(3.25,-5.675) 32(3.75,-5.675) 49(3.75,5.675) 50(3.25,5.675) 51(2.75,5.675) 52(2.25,5.675) 53(1.75,5.675) 54(1.25,5.675) 55(0.75,5.675) 56(0.25,5.675) 57(-0.25,5.675) 58(-0.75,5.675) 59(-1.25,5.675) 60(-1.75,5.675) 61(-2.25,5.675) 62(-2.75,5.675) 63(-3.25,5.675) 64(-3.75,5.675)
  round 0.5 hole 0.2: 65(-1.8,-1.8) 65(-1.8,-0.6) 65(-1.8,0.6) 65(-1.8,1.8) 65(-0.6,-1.8) 65(-0.6,-0.6) 65(-0.6,0.6) 65(-0.6,1.8) 65(0.6,-1.8) 65(0.6,-0.6) 65(0.6,0.6) 65(0.6,1.8) 65(1.8,-1.8) 65(1.8,-0.6) 65(1.8,0.6) 65(1.8,1.8)
  rect 5x5 smd: 65(0,0)
  rect 4.1x4.1 smd far side: 65(0,0)
  round 0.495 on Top Paste: Un1(0,-2.15) Un2(-1.2,2.15) Un3(1.2,2.15) Un7(-2.15,-1.2) Un8(1.2,-2.15) Un14(2.15,-1.2) Un16(2.15,0) Un17(0,2.15) Un19(2.15,1.2) Un20(-2.15,1.2) Un21(-1.2,-2.15) Un25(-2.15,0)
  round 0.46 on Top Paste: Un4(2.15,-2.15) Un18(2.15,2.15) Un22(-2.15,2.15) Un23(-2.15,-2.15)
  rrect25% 0.967x0.967 on Top Paste: Un5(1.2,0) Un6(0,0) Un9(0,-1.2) Un10(1.2,1.2) Un11(1.2,-1.2) Un12(0,1.2) Un13(-1.2,0) Un15(-1.2,-1.2) Un24(-1.2,1.2)
F.SilkS:
  lines w0.12: -6.45,4.16 -5.11,4.16 -5.11,5.11 -4.16,5.11 ; -5.11,-4.16 -5.11,-5.11 -4.16,-5.11 ; 4.16,-5.11 5.11,-5.11 5.11,-4.16 ; 4.16,5.11 5.11,5.11 5.11,4.16
F.Paste:
  region: 0.414,-1.996 0.414,-2.362 -0.414,-2.362 -0.414,-1.996 -0.356,-1.938 0.356,-1.938
  region: -0.786,1.996 -0.844,1.938 -1.556,1.938 -1.614,1.996 -1.614,2.362 -0.786,2.362
  region: 1.614,1.996 1.556,1.938 0.844,1.938 0.786,1.996 0.786,2.362 1.614,2.362
  region: 2.328,-2.328 1.972,-2.328 1.972,-2.058 2.058,-1.972 2.328,-1.972
  region: -1.938,-0.844 -1.938,-1.556 -1.996,-1.614 -2.362,-1.614 -2.362,-0.786 -1.996,-0.786
  region: 1.614,-1.996 1.614,-2.362 0.786,-2.362 0.786,-1.996 0.844,-1.938 1.556,-1.938
  region: 2.362,-1.614 1.996,-1.614 1.938,-1.556 1.938,-0.844 1.996,-0.786 2.362,-0.786
  region: 2.362,-0.414 1.996,-0.414 1.938,-0.356 1.938,0.356 1.996,0.414 2.362,0.414
  region: 0.414,1.996 0.356,1.938 -0.356,1.938 -0.414,1.996 -0.414,2.362 0.414,2.362
  region: 2.328,1.972 2.058,1.972 1.972,2.058 1.972,2.328 2.328,2.328
  region: 2.362,0.786 1.996,0.786 1.938,0.844 1.938,1.556 1.996,1.614 2.362,1.614
  region: -1.938,1.556 -1.938,0.844 -1.996,0.786 -2.362,0.786 -2.362,1.614 -1.996,1.614
  region: -0.786,-1.996 -0.786,-2.362 -1.614,-2.362 -1.614,-1.996 -1.556,-1.938 -0.844,-1.938
  region: -1.972,2.058 -2.058,1.972 -2.328,1.972 -2.328,2.328 -1.972,2.328
  region: -1.972,-2.058 -1.972,-2.328 -2.328,-2.328 -2.328,-1.972 -2.058,-1.972
  region: -1.938,0.356 -1.938,-0.356 -1.996,-0.414 -2.362,-0.414 -2.362,0.414 -1.996,0.414
F.CrtYd:
  lines w0.05: -6.7,-4.15 -5.25,-4.15 -5.25,-5.25 -4.15,-5.25 -4.15,-6.7 0,-6.7 4.15,-6.7 4.15,-5.25 5.25,-5.25 5.25,-4.15 6.7,-4.15 6.7,0 6.7,4.15 5.25,4.15 5.25,5.25 4.15,5.25 4.15,6.7 0,6.7 -4.15,6.7 -4.15,5.25 -5.25,5.25 -5.25,4.15 -6.7,4.15 -6.7,0 -6.7,-4.15
F.Fab:
  lines w0.1: -5,-5 -5,4 -4,5 5,5 5,-5 -5,-5
  text "'.Designator'" at -4.047,-0.84 h1
3D body "LQFP-64-1EP_10x10mm_P0.5mm_EP6.5x6.5mm.step": height 1.5, standoff 0, extent -6,-6 6,6

## LQFP-64-1EP_10x10mm_P0.5mm_EP6.5x6.5mm [mm]
pads (90):
  rrect25% 1.475x0.3 smd: 1(-5.663,3.75) 2(-5.663,3.25) 3(-5.663,2.75) 4(-5.663,2.25) 5(-5.663,1.75) 6(-5.663,1.25) 7(-5.663,0.75) 8(-5.663,0.25) 9(-5.663,-0.25) 10(-5.663,-0.75) 11(-5.663,-1.25) 12(-5.663,-1.75) 13(-5.663,-2.25) 14(-5.663,-2.75) 15(-5.663,-3.25) 16(-5.663,-3.75) 33(5.663,-3.75) 34(5.663,-3.25) 35(5.663,-2.75) 36(5.663,-2.25) 37(5.663,-1.75) 38(5.663,-1.25) 39(5.663,-0.75) 40(5.663,-0.25) 41(5.663,0.25) 42(5.663,0.75) 43(5.663,1.25) 44(5.663,1.75) 45(5.663,2.25) 46(5.663,2.75) 47(5.663,3.25) 48(5.663,3.75)
  rrect25% 0.3x1.475 smd: 17(-3.75,-5.663) 18(-3.25,-5.663) 19(-2.75,-5.663) 20(-2.25,-5.663) 21(-1.75,-5.663) 22(-1.25,-5.663) 23(-0.75,-5.663) 24(-0.25,-5.663) 25(0.25,-5.663) 26(0.75,-5.663) 27(1.25,-5.663) 28(1.75,-5.663) 29(2.25,-5.663) 30(2.75,-5.663) 31(3.25,-5.663) 32(3.75,-5.663) 49(3.75,5.663) 50(3.25,5.663) 51(2.75,5.663) 52(2.25,5.663) 53(1.75,5.663) 54(1.25,5.663) 55(0.75,5.663) 56(0.25,5.663) 57(-0.25,5.663) 58(-0.75,5.663) 59(-1.25,5.663) 60(-1.75,5.663) 61(-2.25,5.663) 62(-2.75,5.663) 63(-3.25,5.663) 64(-3.75,5.663)
  rect 6.5x6.5 smd: 65(0,0)
  rrect24% 1.05x1.05 on Top Paste: Un1(1.3,-2.6) Un2(1.3,1.3) Un3(-1.3,0) Un4(-2.6,-2.6) Un5(2.6,-2.6) Un6(0,0) Un7(-1.3,-1.3) Un8(0,2.6) Un9(1.3,0) Un10(-2.6,-1.3) Un11(-2.6,0) Un12(-1.3,1.3) Un13(2.6,-1.3) Un14(0,1.3) Un15(-2.6,1.3) Un16(0,-2.6) Un17(2.6,0) Un18(0,-1.3) Un19(1.3,2.6) Un20(-1.3,-2.6) Un21(-2.6,2.6) Un22(-1.3,2.6) Un23(2.6,2.6) Un24(1.3,-1.3) Un25(2.6,1.3)
F.SilkS:
  lines w0.12: -6.4,4.16 -5.11,4.16 -5.11,5.11 -4.16,5.11 ; -5.11,-4.16 -5.11,-5.11 -4.16,-5.11 ; 4.16,-5.11 5.11,-5.11 5.11,-4.16 ; 4.16,5.11 5.11,5.11 5.11,4.16
F.CrtYd:
  lines w0.05: -6.65,-4.15 -6.65,0 -6.65,4.15 -5.25,4.15 -5.25,5.25 -4.15,5.25 -4.15,6.65 0,6.65 4.15,6.65 4.15,5.25 5.25,5.25 5.25,4.15 6.65,4.15 6.65,0 6.65,-4.15 5.25,-4.15 5.25,-5.25 4.15,-5.25 4.15,-6.65 0,-6.65 -4.15,-6.65 -4.15,-5.25 -5.25,-5.25 -5.25,-4.15 -6.65,-4.15
F.Fab:
  lines w0.1: -5,-5 -5,4 -4,5 5,5 5,-5 -5,-5
  text "'.Designator'" at -4.047,-0.84 h1
3D body "LQFP-64-1EP_10x10mm_P0.5mm_EP6.5x6.5mm.step": height 1.5, standoff 0, extent -6,-6 6,6

## LQFP-64-1EP_10x10mm_P0.5mm_EP6.5x6.5mm_ThermalVias [mm]
pads (127):
  rrect25% 1.475x0.3 smd: 1(-5.663,3.75) 2(-5.663,3.25) 3(-5.663,2.75) 4(-5.663,2.25) 5(-5.663,1.75) 6(-5.663,1.25) 7(-5.663,0.75) 8(-5.663,0.25) 9(-5.663,-0.25) 10(-5.663,-0.75) 11(-5.663,-1.25) 12(-5.663,-1.75) 13(-5.663,-2.25) 14(-5.663,-2.75) 15(-5.663,-3.25) 16(-5.663,-3.75) 33(5.663,-3.75) 34(5.663,-3.25) 35(5.663,-2.75) 36(5.663,-2.25) 37(5.663,-1.75) 38(5.663,-1.25) 39(5.663,-0.75) 40(5.663,-0.25) 41(5.663,0.25) 42(5.663,0.75) 43(5.663,1.25) 44(5.663,1.75) 45(5.663,2.25) 46(5.663,2.75) 47(5.663,3.25) 48(5.663,3.75)
  rrect25% 0.3x1.475 smd: 17(-3.75,-5.663) 18(-3.25,-5.663) 19(-2.75,-5.663) 20(-2.25,-5.663) 21(-1.75,-5.663) 22(-1.25,-5.663) 23(-0.75,-5.663) 24(-0.25,-5.663) 25(0.25,-5.663) 26(0.75,-5.663) 27(1.25,-5.663) 28(1.75,-5.663) 29(2.25,-5.663) 30(2.75,-5.663) 31(3.25,-5.663) 32(3.75,-5.663) 49(3.75,5.663) 50(3.25,5.663) 51(2.75,5.663) 52(2.25,5.663) 53(1.75,5.663) 54(1.25,5.663) 55(0.75,5.663) 56(0.25,5.663) 57(-0.25,5.663) 58(-0.75,5.663) 59(-1.25,5.663) 60(-1.75,5.663) 61(-2.25,5.663) 62(-2.75,5.663) 63(-3.25,5.663) 64(-3.75,5.663)
  round 0.5 hole 0.2: 65(-2.4,-2.4) 65(-2.4,-1.2) 65(-2.4,0) 65(-2.4,1.2) 65(-2.4,2.4) 65(-1.2,-2.4) 65(-1.2,-1.2) 65(-1.2,0) 65(-1.2,1.2) 65(-1.2,2.4) 65(0,-2.4) 65(0,-1.2) 65(0,0) 65(0,1.2) 65(0,2.4) 65(1.2,-2.4) 65(1.2,-1.2) 65(1.2,0) 65(1.2,1.2) 65(1.2,2.4) 65(2.4,-2.4) 65(2.4,-1.2) 65(2.4,0) 65(2.4,1.2) 65(2.4,2.4)
  rect 6.5x6.5 smd: 65(0,0)
  rect 5.3x5.3 smd far side: 65(0,0)
  rrect25% 0.967x0.967 on Top Paste: Un1(-1.8,-0.6) Un3(0.6,-0.6) Un5(-1.8,-1.8) Un6(1.8,-0.6) Un7(0.6,0.6) Un10(1.8,1.8) Un13(0.6,1.8) Un16(-1.8,1.8) Un17(-0.6,1.8) Un18(-0.6,-0.6) Un22(-0.6,0.6) Un24(0.6,-1.8) Un25(1.8,-1.8) Un28(-1.8,0.6) Un33(1.8,0.6) Un34(-0.6,-1.8)
  rrect25% 0.967x0.685 on Top Paste: Un2(-0.6,2.825) Un12(0.6,2.825) Un14(-1.8,-2.825) Un15(0.6,-2.825) Un20(-0.6,-2.825) Un26(1.8,2.825) Un30(-1.8,2.825) Un31(1.8,-2.825)
  rrect25% 0.685x0.967 on Top Paste: Un4(2.825,-1.8) Un8(2.825,-0.6) Un9(-2.825,0.6) Un11(-2.825,-0.6) Un23(-2.825,1.8) Un27(2.825,1.8) Un35(-2.825,-1.8) Un36(2.825,0.6)
  round 0.602 on Top Paste: Un19(-2.825,-2.825) Un21(-2.825,2.825) Un29(2.825,-2.825) Un32(2.825,2.825)
F.SilkS:
  lines w0.12: -6.4,4.16 -5.11,4.16 -5.11,5.11 -4.16,5.11 ; -5.11,-4.16 -5.11,-5.11 -4.16,-5.11 ; 4.16,-5.11 5.11,-5.11 5.11,-4.16 ; 4.16,5.11 5.11,5.11 5.11,4.16
F.Paste:
  region: -2.566,-2.635 -2.566,-3.084 -3.084,-3.084 -3.084,-2.566 -2.635,-2.566
  region: -2.566,2.635 -2.635,2.566 -3.084,2.566 -3.084,3.084 -2.566,3.084
  region: 3.084,-3.084 2.566,-3.084 2.566,-2.635 2.635,-2.566 3.084,-2.566
  region: 3.084,2.566 2.635,2.566 2.566,2.635 2.566,3.084 3.084,3.084
F.CrtYd:
  lines w0.05: -6.65,-4.15 -6.65,0 -6.65,4.15 -5.25,4.15 -5.25,5.25 -4.15,5.25 -4.15,6.65 0,6.65 4.15,6.65 4.15,5.25 5.25,5.25 5.25,4.15 6.65,4.15 6.65,0 6.65,-4.15 5.25,-4.15 5.25,-5.25 4.15,-5.25 4.15,-6.65 0,-6.65 -4.15,-6.65 -4.15,-5.25 -5.25,-5.25 -5.25,-4.15 -6.65,-4.15
F.Fab:
  lines w0.1: -5,-5 5,-5 5,5 -4,5 -5,4 -5,-5
  text "'.Designator'" at -4.047,-0.84 h1
3D body "LQFP-64-1EP_10x10mm_P0.5mm_EP6.5x6.5mm.step": height 1.5, standoff 0, extent -6,-6 6,6